# Altium footprint library Miscellaneous Devices LC.PcbLib: 733 footprints (part 15 of 46)
Each footprint in its own frame and in the unit in brackets; x right, y up, seen from the top. Pads: shape width x height; smd on the part's side, far side on the other; paste and mask are expansions set on the pad; w line width, h text height; cw(c..) or ccw(c..) is an arc to the next point about the centre after c.
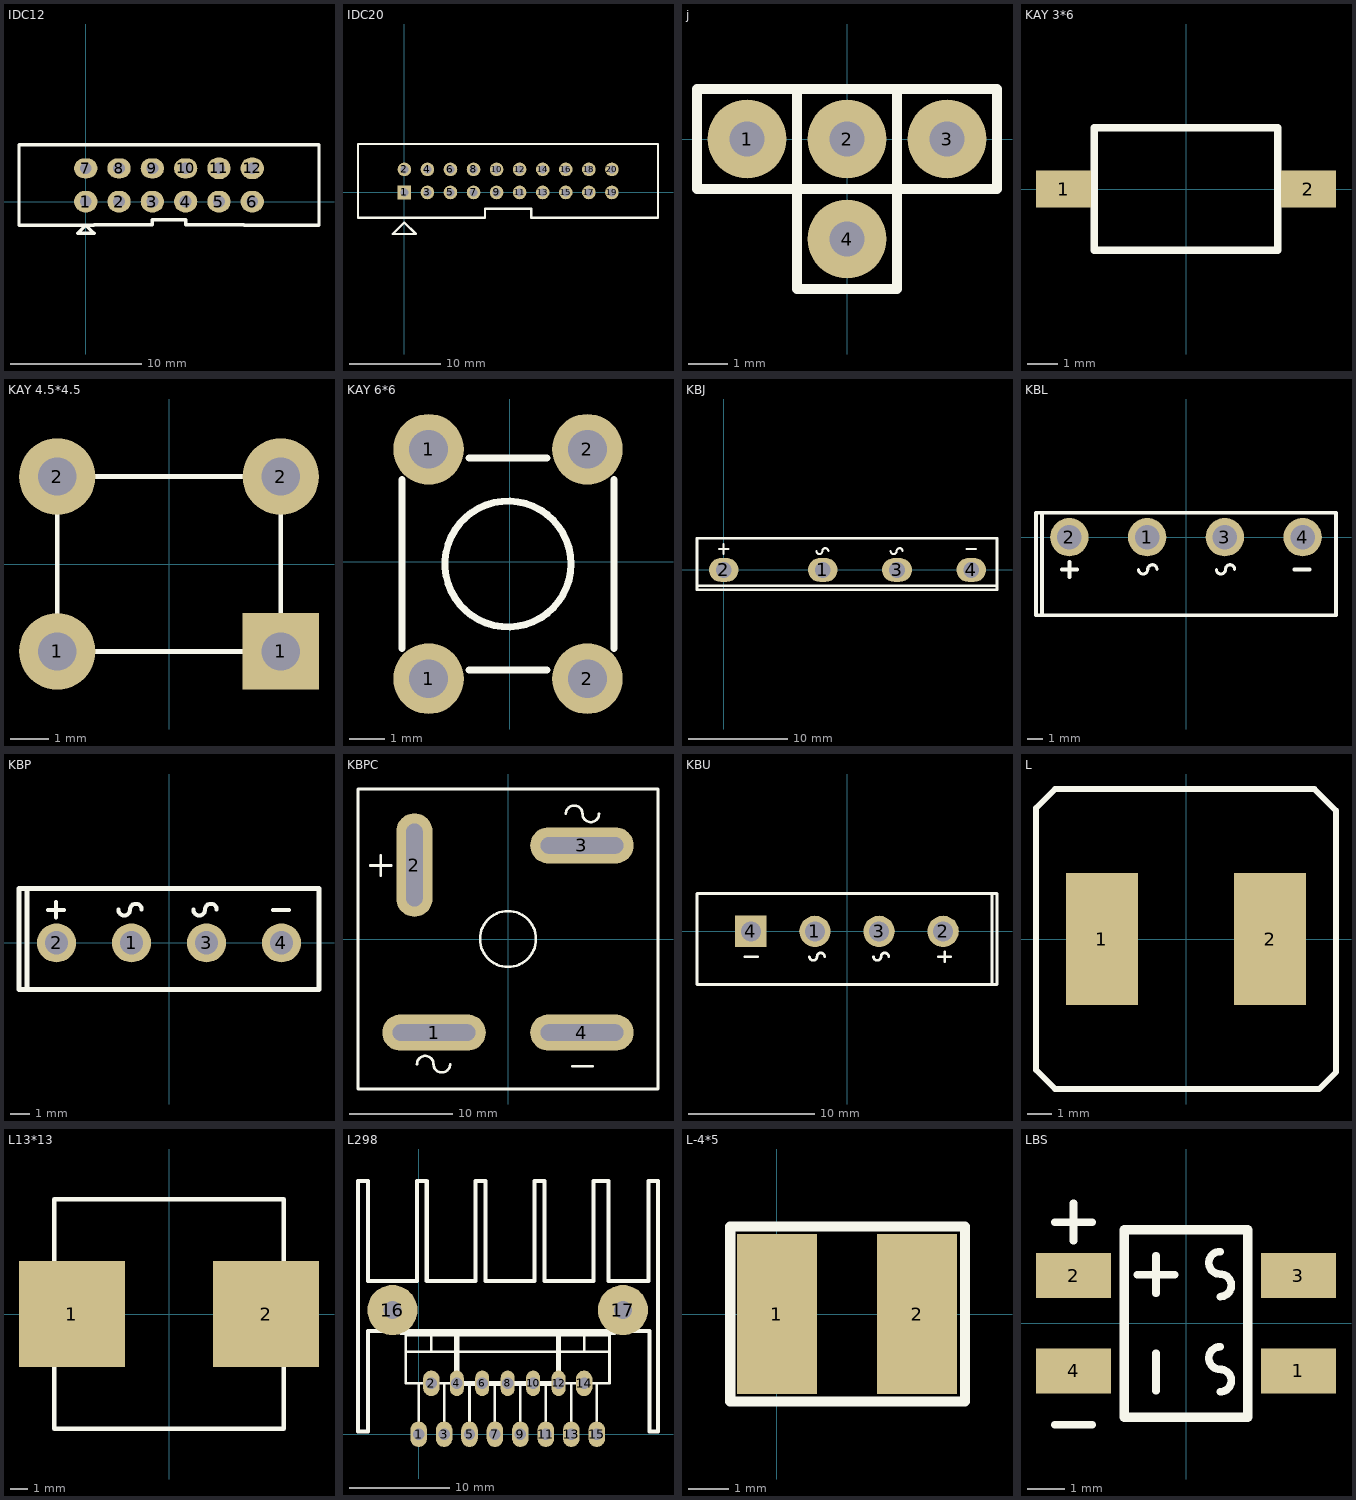
[diagram p14: the footprints below, top view; thin cyan lines are the x and y axes]

## IDC12 [mm]
pads (12):
  oval 1.778x1.65 hole 0.9: 1(0,0) 2(2.54,0) 3(5.08,0) 4(7.62,0) 5(10.16,0) 6(12.7,0) 11(10.16,2.54) 12(12.7,2.54)
  oval 1.778x1.524 hole 0.9: 7(0,2.54) 8(2.54,2.54) 9(5.08,2.54) 10(7.62,2.54)
Top Overlay:
  lines w0.254: -0.635,-2.413 -0.619,-2.413 ; -0.619,-2.413 0,-1.794 0.619,-2.413 0.635,-2.413 -0.619,-2.413 ; -5.095,-1.794 0.627,-1.794 0.643,-1.778 5.08,-1.778 5.08,-1.397 7.62,-1.397 7.62,-1.778 12.057,-1.778 12.073,-1.794 17.795,-1.794 17.795,4.334 -5.095,4.334 -5.095,-1.794

## IDC20 [mm]
pads (20):
  rect 1.5x1.5 hole 0.9: 1(0,0)
  round 1.5 hole 0.9: 2(0,2.54) 3(2.54,0) 4(2.54,2.54) 5(5.08,0) 6(5.08,2.54) 7(7.62,0) 8(7.62,2.54) 9(10.16,0) 10(10.16,2.54) 11(12.7,0) 12(12.7,2.54) 13(15.24,0) 14(15.24,2.54) 15(17.78,0) 16(17.78,2.54) 17(20.32,0) 18(20.32,2.54) 19(22.86,0) 20(22.86,2.54)
Top Overlay:
  lines w0.254: -5.105,-2.794 -5.105,5.334 27.94,5.334 27.94,-2.794 13.97,-2.794 13.97,-1.803 8.89,-1.803 8.89,-2.794 -5.105,-2.794 ; -1.27,-4.572 0,-3.302 1.27,-4.572 -1.27,-4.572

## j [mm]
pads (4):
  round 2 hole 0.9: 1(-2.54,0) 2(0,0) 3(2.54,0) 4(0,-2.54)
Top Overlay:
  lines w0.254: -1.27,1.27 -1.27,-1.27 ; 1.27,1.27 1.27,-1.27 ; -1.27,-1.27 -3.81,-1.27 -3.81,1.27 3.81,1.27 3.81,-1.27 1.27,-1.27 ; -1.27,-1.27 -1.27,-3.81 1.27,-3.81 1.27,-1.27 ; -1.27,-1.27 1.27,-1.27

## KAY 3*6 [mm]
pads (2):
  rect 1.8x1.2 smd: 1(-4,0) 2(4,0)
Top Overlay:
  lines w0.254: -3,-2 -3,2 3,2 3,-2 -3,-2

## KAY 4.5*4.5 [mm]
pads (4):
  round 2 hole 1: 1(-2.921,-2.286) 2(-2.921,2.286) 2(2.921,2.286)
  rect 2x2 hole 1: 1(2.921,-2.286)
Top Overlay:
  lines w0.127: -2.921,-2.286 -2.286,-2.286 2.286,-2.286 2.921,-2.286 2.921,2.286 2.286,2.286 -2.286,2.286 -2.921,2.286 -2.921,-2.286

## KAY 6*6 [mm]
pads (4):
  round 2 hole 1.1: 1(-2.306,-3.312) 1(-2.306,3.191) 2(2.194,-3.312) 2(2.194,3.191)
Top Overlay:
  circle w0.2: c-0.056,-0.061 r1.785
  lines w0.2: -3.056,-2.461 -3.056,2.339 ; -1.156,-3.061 1.044,-3.061 ; -1.156,2.939 1.044,2.939 ; 2.944,-2.461 2.944,2.339

## KBJ [mm]
pads (4):
  oval 3x2.4 hole 1.6: 1(10,0) 2(0,0) 3(17.5,0) 4(25,0)
Top Overlay:
  lines w0.203: -0.5,2.1 0.5,2.1 ; 0,1.6 0,2.6 ; 9.36,1.9 ccw(c9.66,1.9) 9.96,1.9 cw(c10.26,1.9) 10.56,1.9 ; 16.86,1.9 ccw(c17.16,1.9) 17.46,1.9 cw(c17.76,1.9) 18.06,1.9 ; 24.5,2.1 25.5,2.1
  lines w0.254: -2.7,-1.6 27.6,-1.6 ; -2.7,-2 27.6,-2 27.6,3.2 -2.7,3.2 -2.7,-2

## KBL [mm]
pads (4):
  round 2.5 hole 1.6: 1(-2.54,0) 2(-7.62,0) 3(2.54,0) 4(7.62,0)
Top Overlay:
  lines w0.203: -3.1,-2.1 ccw(c-2.8,-2.1) -2.5,-2.1 cw(c-2.2,-2.1) -1.9,-2.1 ; 1.98,-2.1 ccw(c2.28,-2.1) 2.58,-2.1 cw(c2.88,-2.1) 3.18,-2.1
  lines w0.254: -9.4,-5.1 -9.4,1.5 ; -8.12,-2.1 -7.12,-2.1 ; -7.62,-2.6 -7.62,-1.6 ; 7.08,-2.1 8.08,-2.1 ; -9.8,-5.1 -9.8,1.6 9.8,1.6 9.8,-5.1 -9.8,-5.1

## KBP [mm]
pads (4):
  round 2 hole 1.2: 1(-1.925,0) 2(-5.775,0) 3(1.925,0) 4(5.775,0)
Top Overlay:
  lines w0.203: -6.2,1.7 -5.4,1.7 ; -5.8,1.3 -5.8,2.1 ; -2.6,1.708 ccw(c-2.3,1.708) -2,1.708 cw(c-1.7,1.708) -1.4,1.708 ; 1.25,1.708 ccw(c1.55,1.708) 1.85,1.708 cw(c2.15,1.708) 2.45,1.708 ; 5.35,1.7 6.15,1.7
  lines w0.254: -7.3,-2.4 -7.3,2.8 ; -7.7,-2.4 -7.7,2.8 7.7,2.8 7.7,-2.4 -7.7,-2.4

## KBPC [mm]
pads (4):
  oval 10x3.5 hole 1.6 slot 8 at 0 deg: 1(-7.15,-9.05) 3(7.15,9.05) 4(7.15,-9.05)
  oval 3.5x10 hole 1.6 slot 8 at 90 deg: 2(-9.05,7.15)
Top Overlay:
  circle w0.254: c0,0 r2.7
  lines w0.254: -13.3,7.1 -11.3,7.1 ; -12.3,6.1 -12.3,8.1 ; -8.8,-12.1 cw(c-8,-12.1) -7.2,-12.1 ccw(c-6.4,-12.1) -5.6,-12.1 ; 5.6,12.1 cw(c6.4,12.1) 7.2,12.1 ccw(c8,12.1) 8.8,12.1 ; 6.2,-12.3 8.2,-12.3 ; -14.5,-14.5 14.5,-14.5 14.5,14.5 -14.5,14.5 -14.5,-14.5

## KBU [mm]
pads (4):
  round 2.5 hole 1.6: 1(-2.54,0) 2(7.62,0) 3(2.54,0)
  rect 2.5x2.5 hole 1.6: 4(-7.62,0)
Top Overlay:
  lines w0.203: -8.1,-2 -7.1,-2 ; -2.98,-2 ccw(c-2.68,-2) -2.38,-2 cw(c-2.08,-2) -1.78,-2 ; 2.1,-2 ccw(c2.4,-2) 2.7,-2 cw(c3,-2) 3.3,-2 ; 7.24,-2 8.24,-2 ; 7.74,-2.4 7.74,-1.6
  lines w0.254: 11.5,-4.2 11.5,3 ; -11.9,-4.2 -11.9,3 11.9,3 11.9,-4.2 -11.9,-4.2

## L [mm]
pads (2):
  rect 3x5.5 smd: 1(-3.5,0) 2(3.5,0)
Top Overlay:
  lines w0.254: -6.25,-5.45 -6.25,5.45 -5.45,6.25 5.35,6.25 6.25,5.35 6.25,-5.55 5.55,-6.25 -5.45,-6.25 -6.25,-5.45

## L13*13 [mm]
pads (2):
  rect 6x6 smd: 1(-5.5,0) 2(5.5,0)
Top Overlay:
  lines w0.254: -6.5,-6.5 6.5,-6.5 6.5,6.5 -6.5,6.5 -6.5,-6.5

## L298 [mil]
pads (17):
  oval 65x100 hole 45: 1(0,0) 2(50,200) 3(100,0) 5(200,0) 7(300,0) 9(400,0) 11(500,0) 13(600,0) 14(650,200) 15(700,0)
  oval 55x100 hole 45: 4(150,200) 6(250,200) 8(350,200) 10(450,200) 12(550,200)
  round 196.85 hole 70: 16(-102.76,488) 17(802.76,488)
Top Overlay:
  lines w10: -70,395 770,395 ; -50,325 750,325 ; 0,0 0,200 ; 50,325 50,390 ; 100,0 100,200 ; 200,0 200,200 ; 300,0 300,200 ; 400,0 400,200 ; 500,0 500,200 ; 600,0 600,200 ; 650,325 650,390 ; 700,0 700,200 ; -50,200 -50,390 750,390 750,200 -50,200
  lines w16: 901.18,405 -199.16,405 -199.16,11 -238.16,11 -238.16,995 -199.16,995 -199.16,602 -7.16,602 -7.16,995 31.84,995 31.84,602 223.84,602 223.84,995 262.84,995 262.84,602 454.84,602 454.84,995 494.84,995 494.84,602 686.84,602 686.84,995 745.84,995 745.84,602 902.84,602 902.84,995 940.55,995 940.55,11 907.84,11 907.84,405
  lines w20: 150,400 150,200 550,200 550,400

## L-4*5 [mm]
pads (2):
  rect 2x4 smd: 1(0,0) 2(3.5,0)
Top Overlay:
  lines w0.254: -1.168,-2.184 4.699,-2.184 4.699,2.184 -1.168,2.184 -1.168,-2.184

## LBS [mm]
pads (4):
  rect 2x1.2 smd: 1(3,-1.27) 2(-3,1.27) 3(3,1.27) 4(-3,-1.27)
Top Overlay:
  lines w0.203: -3.5,-2.7 -2.5,-2.7 ; -3.5,2.7 -2.5,2.7 ; -3,2.2 -3,3.2 ; -1.3,1.3 -0.3,1.3 ; -0.8,-1.8 -0.8,-0.8 ; -0.8,0.8 -0.8,1.8 ; 0.908,-1.825 ccw(c0.908,-1.525) 0.908,-1.225 cw(c0.908,-0.925) 0.908,-0.625 ; 0.908,0.715 ccw(c0.908,1.015) 0.908,1.315 cw(c0.908,1.615) 0.908,1.915
  lines w0.254: -1.651,-2.5 -1.651,2.5 1.651,2.5 1.651,-2.5 -1.651,-2.5